# Altium footprint library Connectors.PcbLib: 104 footprints (part 4 of 7)
Each footprint in its own frame and in the unit in brackets; x right, y up, seen from the top. Pads: shape width x height; smd on the part's side, far side on the other; paste and mask are expansions set on the pad; w line width, h text height; cw(c..) or ccw(c..) is an arc to the next point about the centre after c.
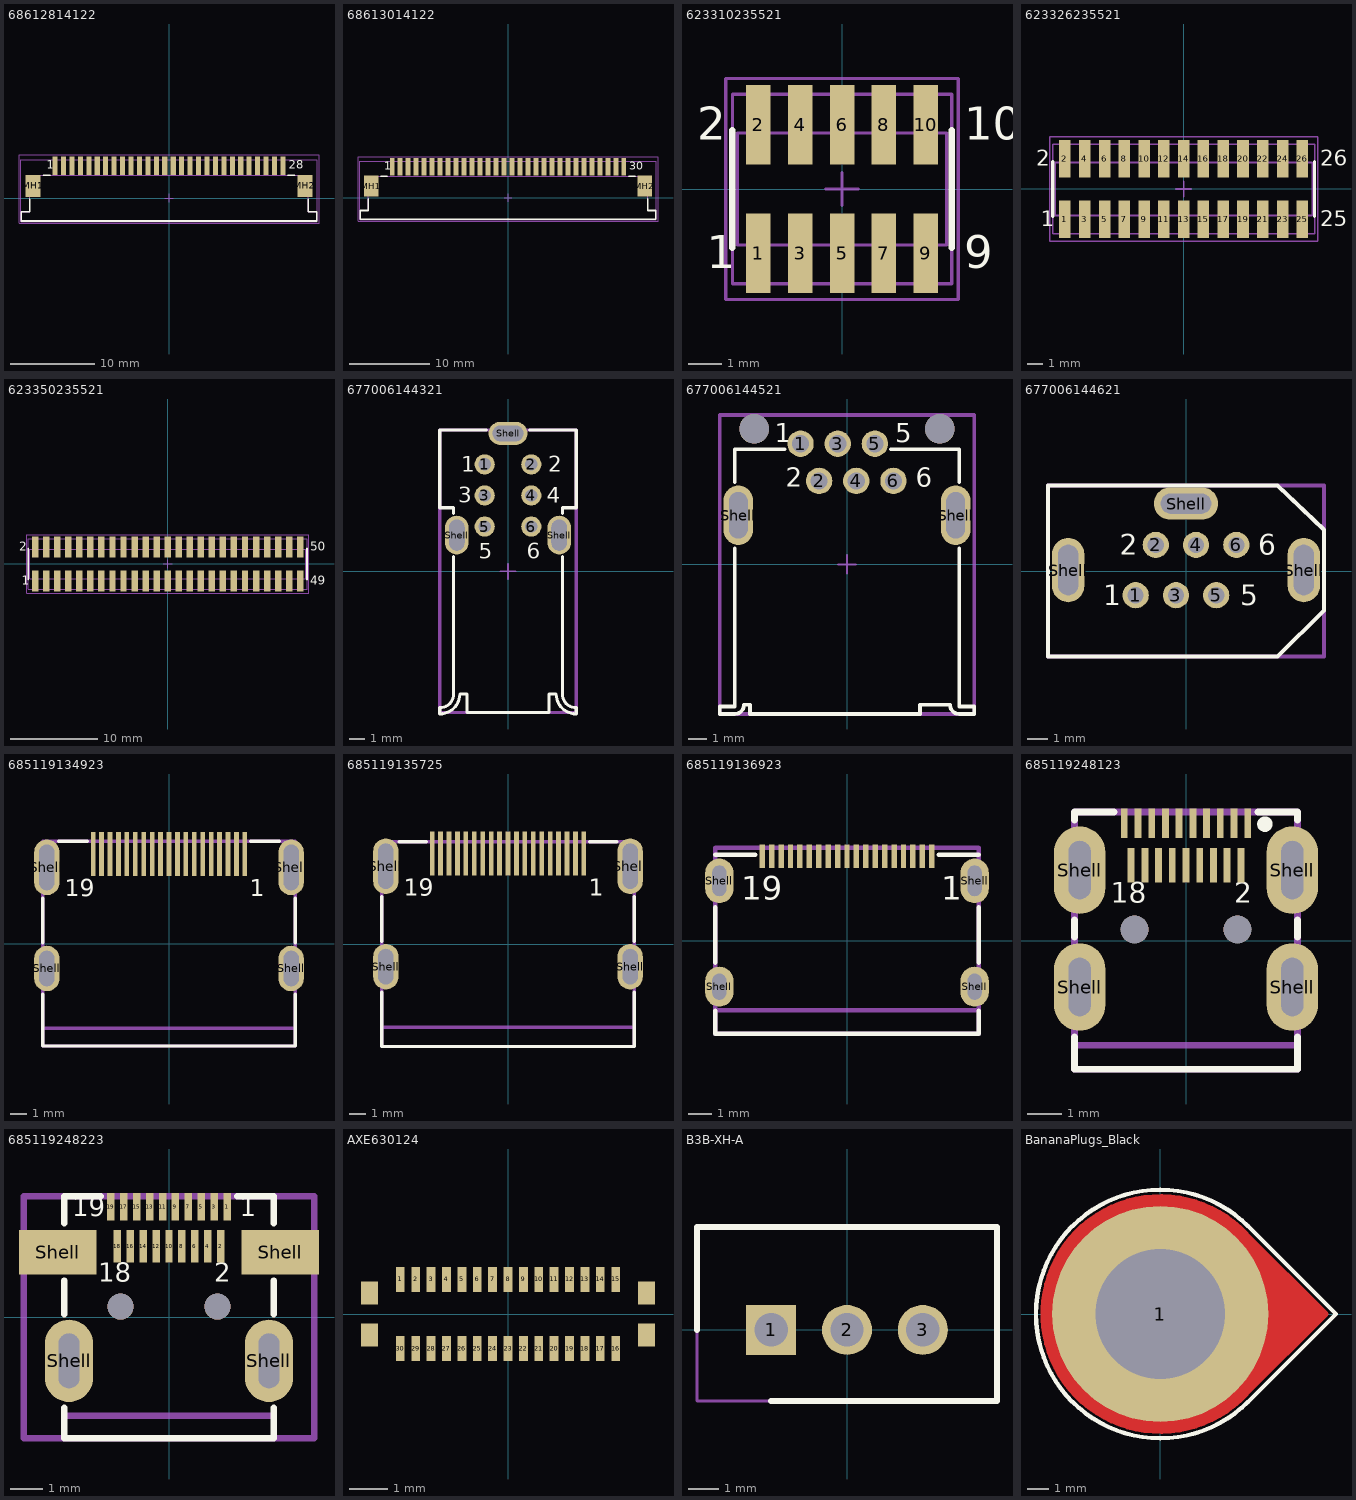
[diagram p3: the footprints below, top view; thin cyan lines are the x and y axes]

## 68612814122 [mm] "ZIF Connectors, Horizontal, Top Contact, pitch 1mm, 28p"
height 3.15
pads (30):
  rect 0.6x2.2 smd: 1(-13.5,3.85) 2(-12.5,3.85) 3(-11.5,3.85) 4(-10.5,3.85) 5(-9.5,3.85) 6(-8.5,3.85) 7(-7.5,3.85) 8(-6.5,3.85) 9(-5.5,3.85) 10(-4.5,3.85) 11(-3.5,3.85) 12(-2.5,3.85) 13(-1.5,3.85) 14(-0.5,3.85) 15(0.5,3.85) 16(1.5,3.85) 17(2.5,3.85) 18(3.5,3.85) 19(4.5,3.85) 20(5.5,3.85) 21(6.5,3.85) 22(7.5,3.85) 23(8.5,3.85) 24(9.5,3.85) 25(10.5,3.85) 26(11.5,3.85) 27(12.5,3.85) 28(13.5,3.85)
  rect 1.8x2.6 smd: MH1(-16.1,1.45) MH2(16.1,1.45)
Top Overlay:
  lines w0.2: -16.5,-0.15 -16.5,-1.6 -17.5,-1.6 -17.5,-2.7 17.5,-2.7 17.5,-1.6 16.5,-1.6 16.5,-0.15 ; -14.9,2.7 -14.1,2.7 ; 14.1,2.7 14.9,2.7
  text "1" at -14.5,3.5 h1
  text "28" at 14.2,3.5 h1
Mechanical 11:
  lines w0.1: -17.5,-2.7 17.5,-2.7 17.5,-1.6 16.5,-1.6 16.5,2.7 -16.5,2.7 -16.5,-1.6 -17.5,-1.6 -17.5,-2.7
Mechanical 13:
  lines w0.1: -17.575,-2.775 -17.575,4.575 17.575,4.575 17.575,-2.775 -17.575,-2.775
Mechanical 15:
  lines w0.1: -0.5,0 0.5,0 ; 0,-0.5 0,0.5 ; -17.775,-2.975 17.775,-2.975 17.775,5.15 -17.775,5.15 -17.775,-2.975
3D body "68612814122.stp": height 3.02, standoff 0.02, extent -17.5,-2.7 17.5,4.4

## 68613014122 [mm] "ZIF Connectors, Horizontal, Top Contact, pitch 1mm, 30p"
height 3.15
pads (32):
  rect 0.6x2.2 smd: 1(-14.5,3.85) 2(-13.5,3.85) 3(-12.5,3.85) 4(-11.5,3.85) 5(-10.5,3.85) 6(-9.5,3.85) 7(-8.5,3.85) 8(-7.5,3.85) 9(-6.5,3.85) 10(-5.5,3.85) 11(-4.5,3.85) 12(-3.5,3.85) 13(-2.5,3.85) 14(-1.5,3.85) 15(-0.5,3.85) 16(0.5,3.85) 17(1.5,3.85) 18(2.5,3.85) 19(3.5,3.85) 20(4.5,3.85) 21(5.5,3.85) 22(6.5,3.85) 23(7.5,3.85) 24(8.5,3.85) 25(9.5,3.85) 26(10.5,3.85) 27(11.5,3.85) 28(12.5,3.85) 29(13.5,3.85) 30(14.5,3.85)
  rect 1.8x2.6 smd: MH1(-17.1,1.45) MH2(17.1,1.45)
Top Overlay:
  lines w0.2: -17.5,-0.15 -17.5,-1.6 -18.5,-1.6 -18.5,-2.7 18.5,-2.7 18.5,-1.6 17.5,-1.6 17.5,-0.15 ; -15.9,2.7 -15.1,2.7 ; 15.1,2.7 15.9,2.7
  text "30" at 15.2,3.5 h1
  text "1" at -15.5,3.5 h1
Mechanical 11:
  lines w0.1: -18.5,-2.7 -18.5,-1.6 -17.5,-1.6 -17.5,2.7 17.5,2.7 17.5,-1.6 18.5,-1.6 18.5,-2.7 -18.5,-2.7
Mechanical 13:
  lines w0.1: -18.575,-2.775 18.575,-2.775 18.575,4.575 -18.575,4.575 -18.575,-2.775
Mechanical 15:
  lines w0.1: -0.5,0 0.5,0 ; 0,-0.5 0,0.5 ; -18.775,-2.975 -18.775,5.15 18.775,5.15 18.775,-2.975 -18.775,-2.975
3D body "68613014122.stp": height 3.02, standoff 0.02, extent -18.5,-2.7 18.5,4.4

## 623310235521 [mm] "Pin Header, pitch 1.27 mm, SMD, Vertical, dual row, 10p"
height 4.45
pads (10):
  rect 0.74x2.4 smd: 1(-2.54,-1.95) 2(-2.54,1.95) 3(-1.27,-1.95) 4(-1.27,1.95) 5(0,-1.95) 6(0,1.95) 7(1.27,-1.95) 8(1.27,1.95) 9(2.54,-1.95) 10(2.54,1.95)
Top Overlay:
  lines w0.2: -3.325,-1.775 -3.325,1.775 ; 3.325,-1.775 3.325,1.775
  text "1" at -4.1,-2.4 h1
  text "2" at -4.4,1.5 h1
  text "9" at 3.7,-2.4 h1
  text "10" at 3.7,1.5 h1
Mechanical 11:
  lines w0.1: -3.175,-1.7 -3.175,1.7 3.175,1.7 3.175,-1.7 -3.175,-1.7
Mechanical 13:
  lines w0.1: -3.325,-2.875 -3.325,2.875 3.325,2.875 3.325,-2.875 -3.325,-2.875
Mechanical 15:
  lines w0.1: -0.5,0 0.5,0 ; 0,-0.5 0,0.5 ; -3.525,-3.35 -3.525,3.35 3.525,3.35 3.525,-3.35 -3.525,-3.35
3D body "623310235521.stp": height 6, standoff 0, extent -3.175,-2.75 3.175,2.75

## 623326235521 [mm] "Pin Header, pitch 1.27 mm, SMD, Vertical, dual row, 26p"
height 4.45
pads (26):
  rect 0.74x2.4 smd: 1(-7.62,-1.95) 2(-7.62,1.95) 3(-6.35,-1.95) 4(-6.35,1.95) 5(-5.08,-1.95) 6(-5.08,1.95) 7(-3.81,-1.95) 8(-3.81,1.95) 9(-2.54,-1.95) 10(-2.54,1.95) 11(-1.27,-1.95) 12(-1.27,1.95) 13(0,-1.95) 14(0,1.95) 15(1.27,-1.95) 16(1.27,1.95) 17(2.54,-1.95) 18(2.54,1.95) 19(3.81,-1.95) 20(3.81,1.95) 21(5.08,-1.95) 22(5.08,1.95) 23(6.35,-1.95) 24(6.35,1.95) 25(7.62,-1.95) 26(7.62,1.95)
Top Overlay:
  lines w0.2: -8.405,-1.775 -8.405,1.775 ; 8.405,-1.775 8.405,1.775
  text "1" at -9.18,-2.4 h1
  text "2" at -9.48,1.5 h1
  text "26" at 8.78,1.5 h1
  text "25" at 8.78,-2.4 h1
Mechanical 11:
  lines w0.1: -8.255,-1.7 -8.255,1.7 8.255,1.7 8.255,-1.7 -8.255,-1.7
Mechanical 13:
  lines w0.1: -8.405,-2.875 -8.405,2.875 8.405,2.875 8.405,-2.875 -8.405,-2.875
Mechanical 15:
  lines w0.1: -0.5,0 0.5,0 ; 0,-0.5 0,0.5 ; -8.605,-3.35 -8.605,3.35 8.605,3.35 8.605,-3.35 -8.605,-3.35
3D body "623326235521.stp": height 6, standoff 0, extent -8.255,-2.75 8.255,2.75

## 623350235521 [mm] "Pin Header, pitch 1.27 mm, SMD, Vertical, dual row, 50p"
height 4.45
pads (50):
  rect 0.74x2.4 smd: 1(-15.24,-1.95) 2(-15.24,1.95) 3(-13.97,-1.95) 4(-13.97,1.95) 5(-12.7,-1.95) 6(-12.7,1.95) 7(-11.43,-1.95) 8(-11.43,1.95) 9(-10.16,-1.95) 10(-10.16,1.95) 11(-8.89,-1.95) 12(-8.89,1.95) 13(-7.62,-1.95) 14(-7.62,1.95) 15(-6.35,-1.95) 16(-6.35,1.95) 17(-5.08,-1.95) 18(-5.08,1.95) 19(-3.81,-1.95) 20(-3.81,1.95) 21(-2.54,-1.95) 22(-2.54,1.95) 23(-1.27,-1.95) 24(-1.27,1.95) 25(0,-1.95) 26(0,1.95) 27(1.27,-1.95) 28(1.27,1.95) 29(2.54,-1.95) 30(2.54,1.95) 31(3.81,-1.95) 32(3.81,1.95) 33(5.08,-1.95) 34(5.08,1.95) 35(6.35,-1.95) 36(6.35,1.95) 37(7.62,-1.95) 38(7.62,1.95) 39(8.89,-1.95) 40(8.89,1.95) 41(10.16,-1.95) 42(10.16,1.95) 43(11.43,-1.95) 44(11.43,1.95) 45(12.7,-1.95) 46(12.7,1.95) 47(13.97,-1.95) 48(13.97,1.95) 49(15.24,-1.95) 50(15.24,1.95)
Top Overlay:
  lines w0.2: -16.025,-1.775 -16.025,1.775 ; 16.025,-1.775 16.025,1.775
  text "1" at -16.8,-2.4 h1
  text "2" at -17.1,1.5 h1
  text "49" at 16.4,-2.4 h1
  text "50" at 16.4,1.5 h1
Mechanical 11:
  lines w0.1: -15.875,-1.7 -15.875,1.7 15.875,1.7 15.875,-1.7 -15.875,-1.7
Mechanical 13:
  lines w0.1: -16.025,-2.875 -16.025,2.875 16.025,2.875 16.025,-2.875 -16.025,-2.875
Mechanical 15:
  lines w0.1: -0.5,0 0.5,0 ; 0,-0.5 0,0.5 ; -16.225,-3.35 -16.225,3.35 16.225,3.35 16.225,-3.35 -16.225,-3.35
3D body "623350235521.stp": height 6, standoff 0, extent -15.875,-2.75 15.875,2.75

## 677006144321 [mm] "IEEE 1394 Up Right Receptacle WR-COM"
height 14
pads (9):
  round 1.3 hole 0.8: 1(-1.5,6.89) 2(1.5,6.89) 3(-1.5,4.89) 4(1.5,4.89) 5(-1.5,2.89) 6(1.5,2.89)
  oval 1.5x2.5 hole 1 slot 2 at 90 deg: Shell(-3.3,2.34) Shell(3.3,2.34)
  oval 2.5x1.5 hole 1 slot 2 at 0 deg: Shell(0,8.89)
Top Overlay:
  lines w0.2: -3.5,0.94 -3.5,-7.89 cw(c-4.4,-7.89) -4.4,-8.79 -4.4,-9.19 ccw(c-4.4,-7.89) -3.1,-7.89 -2.65,-7.89 -2.65,-9.1 2.65,-9.1 2.65,-7.89 3.1,-7.89 ccw(c4.4,-7.89) 4.4,-9.19 4.4,-8.79 cw(c4.4,-7.89) 3.5,-7.89 3.5,0.94 ; -3.5,3.74 -3.5,4.1 -4.4,4.1 -4.4,9.1 -1.4,9.1 ; 1.4,9.1 4.4,9.1 4.4,4.1 3.5,4.1 3.5,3.74
  text "1" at -3,6.415 h1.02
  text "2" at 2.6,6.415 h1.02
  text "3" at -3.2,4.415 h1.02
  text "4" at 2.5,4.415 h1.02
  text "5" at -1.9,0.815 h1.02
  text "6" at 1.2,0.815 h1.02
Mechanical 13:
  lines w0.2: -4.4,-9.1 -4.4,9.1 4.4,9.1 4.4,-9.1 -4.4,-9.1
Mechanical 15:
  lines w0.1: -0.5,0 0.5,0 ; 0,-0.5 0,0.5
3D body "677006144321.stp": height 13.4, standoff -3.24, extent -4.4,-9.1 4.4,9.1

## 677006144521 [mm] "IEEE 1394 Horizontal Receptacle WR-COM"
height 7.95
pads (10):
  round 1.42 hole 0.92: 1(-2.5,6.5) 2(-1.5,4.5) 3(-0.5,6.5) 4(0.5,4.5) 5(1.5,6.5) 6(2.5,4.5)
  oval 1.6x3.2 hole 1 slot 2.5 at 90 deg: Shell(-5.85,2.65) Shell(5.85,2.65)
  round 1.6 hole 1.6 unplated: ""(-5,7.3) ""(5,7.3)
Top Overlay:
  lines w0.2: -6.05,0.88 -6.05,-7.65 -6.85,-7.65 -6.85,-8.05 -6.039,-8.05 ; -6.05,4.43 -6.05,6.2 -3.36,6.2 ; -6.039,-8.05 ccw(c-6.039,-7.561) -5.55,-7.549 -5.22,-7.55 -5.22,-8.05 3.93,-8.05 3.93,-7.55 5.55,-7.55 ; 2.36,6.2 6.05,6.2 6.05,4.43 ; 5.55,-7.549 ccw(c6.039,-7.561) 6.039,-8.05 ; 6.039,-8.05 6.85,-8.05 6.85,-7.65 6.05,-7.65 6.05,0.88
  text "1" at -3.9,6.575 h1.02
  text "5" at 2.6,6.575 h1.02
  text "2" at -3.3,4.175 h1.02
  text "6" at 3.7,4.175 h1.02
Mechanical 13:
  lines w0.2: -6.85,-8.05 -6.85,8.05 6.85,8.05 6.85,-8.05 -6.85,-8.05
Mechanical 15:
  lines w0.1: -0.5,0 0.5,0 ; 0,-0.5 0,0.5
3D body "677006144521.stp": height 8.8, standoff -3.3, extent -6.85,-8.05 6.85,8.05

## 677006144621 [mm] "IEEE 1394 Vertical Receptacle"
height 14.8
pads (9):
  round 1.3 hole 0.8: 1(-2.5,-1.2) 2(-1.5,1.3) 3(-0.5,-1.2) 4(0.5,1.3) 5(1.5,-1.2) 6(2.5,1.3)
  oval 1.6x3.2 hole 1 slot 2.5 at 90 deg: Shell(-5.85,0.05) Shell(5.85,0.05)
  oval 3.2x1.6 hole 1 slot 2.5 at 0 deg: Shell(0,3.35)
Top Overlay:
  lines w0.2: -6.85,-4.25 -6.85,4.25 4.55,4.25 6.85,2.05 6.85,-1.95 4.55,-4.25 -6.85,-4.25
  text "1" at -4.1,-1.7 h1.02
  text "2" at -3.3,0.8 h1.02
  text "5" at 2.7,-1.7 h1.02
  text "6" at 3.6,0.8 h1.02
Mechanical 13:
  lines w0.2: -6.85,-4.25 6.85,-4.25 6.85,4.25 -6.85,4.25 -6.85,-4.25
3D body "677006144621.stp": height 14.8, standoff -3.45, extent -6.85,-4.2 6.85,4.3

## 685119134923 [mm] "HDMI SMT Horizontal"
height 6.13
pads (23):
  rect 0.28x2.6 smd: 1(4.5,5.325) 2(4,5.325) 3(3.5,5.325) 4(3,5.325) 5(2.5,5.325) 6(2,5.325) 7(1.5,5.325) 8(1,5.325) 9(0.5,5.325) 10(0,5.325) 11(-0.5,5.325) 12(-1,5.325) 13(-1.5,5.325) 14(-2,5.325) 15(-2.5,5.325) 16(-3,5.325) 17(-3.5,5.325) 18(-4,5.325) 19(-4.5,5.325)
  oval 1.5x2.7 hole 0.9 slot 2.1 at 90 deg: Shell(-7.25,-1.475) Shell(7.25,-1.475)
  oval 1.5x3.3 hole 0.9 slot 2.7 at 90 deg: Shell(-7.25,4.525) Shell(7.25,4.525)
Top Overlay:
  lines w0.2: -7.5,-2.985 -7.5,-6.075 7.5,-6.075 7.5,-2.985 ; -7.5,0.035 -7.5,2.705 ; -6.55,6.075 -4.84,6.075 ; 4.84,6.075 6.55,6.075 ; 7.5,0.035 7.5,2.705
  text "1" at 4.8,2.8 h1.02
  text "19" at -6.2,2.8 h1.02
Mechanical 13:
  lines w0.2: -7.5,-6.075 -7.5,6.075 7.5,6.075 7.5,-6.075 -7.5,-6.075
Mechanical 15:
  lines w0.2: -7.5,-5.025 7.5,-5.025
  text "PCB Edge" at -1.794,-4.721 h1
3D body "685119134923.stp": height 6.17, standoff -2.21, extent -7.5,-6.075 7.5,6.075

## 685119135725 [mm] "HDMI SMT Horizontal with M3 screw"
height 16.05
pads (23):
  rect 0.28x2.6 smd: 1(4.5,5.385) 2(4,5.385) 3(3.5,5.385) 4(3,5.385) 5(2.5,5.385) 6(2,5.385) 7(1.5,5.385) 8(1,5.385) 9(0.5,5.385) 10(0,5.385) 11(-0.5,5.385) 12(-1,5.385) 13(-1.5,5.385) 14(-2,5.385) 15(-2.5,5.385) 16(-3,5.385) 17(-3.5,5.385) 18(-4,5.385) 19(-4.5,5.385)
  oval 1.5x2.7 hole 0.9 slot 2.1 at 90 deg: Shell(-7.25,-1.335) Shell(7.25,-1.335)
  oval 1.5x3.3 hole 0.9 slot 2.7 at 90 deg: Shell(-7.25,4.625) Shell(7.25,4.625)
Top Overlay:
  lines w0.2: -7.5,-2.845 -7.5,-6.075 7.5,-6.075 7.5,-2.845 ; -7.5,0.175 -7.5,2.815 ; -6.47,6.075 -4.84,6.075 ; 4.84,6.075 6.47,6.075 ; 7.5,0.175 7.5,2.815
  text "19" at -6.2,2.86 h1.02
  text "1" at 4.8,2.86 h1.02
Mechanical 13:
  lines w0.2: -7.5,-6.075 -7.5,6.075 7.5,6.075 7.5,-6.075 -7.5,-6.075
Mechanical 15:
  lines w0.2: -7.5,-4.925 7.5,-4.925
  text "PCB Edge" at -1.794,-4.621 h1
3D body "685119135725.stp": height 16.1, standoff -2.15, extent -7.5,-6.075 7.5,6.075

## 685119136923 [mm] "Mini HDMI SMT Horizontal"
height 3.3
pads (23):
  rect 0.23x1 smd: 1(3.6,3.6) 2(3.2,3.6) 3(2.8,3.6) 4(2.4,3.6) 5(2,3.6) 6(1.6,3.6) 7(1.2,3.6) 8(0.8,3.6) 9(0.4,3.6) 10(0,3.6) 11(-0.4,3.6) 12(-0.8,3.6) 13(-1.2,3.6) 14(-1.6,3.6) 15(-2,3.6) 16(-2.4,3.6) 17(-2.8,3.6) 18(-3.2,3.6) 19(-3.6,3.6)
  oval 1.2x1.7 hole 0.6 slot 1.1 at 90 deg: Shell(-5.425,-1.95) Shell(5.425,-1.95)
  oval 1.2x1.9 hole 0.6 slot 1.3 at 90 deg: Shell(-5.425,2.55) Shell(5.425,2.55)
Top Overlay:
  lines w0.2: -5.6,-2.98 -5.6,-3.95 5.6,-3.95 5.6,-2.98 ; -5.6,-0.92 -5.6,1.42 ; -5.6,3.65 -3.9,3.65 ; 3.9,3.65 5.6,3.65 ; 5.6,-0.92 5.6,1.42
  text "19" at -4.5,1.75 h1.02
  text "1" at 4,1.75 h1.02
Mechanical 13:
  lines w0.2: -5.6,-3.95 5.6,-3.95 5.6,3.95 -5.6,3.95 -5.6,-3.95
Mechanical 15:
  lines w0.2: -5.6,-2.95 5.6,-2.95
  text "PCB Edge" at -1.794,-2.646 h0.89
3D body "685119136923.stp": height 3.29, standoff -2.16, extent -5.625,-3.95 5.625,3.952

## 685119248123 [mm] "Micro HDMI Horizontal SMT"
height 3
pads (25):
  rect 0.2x0.85 smd: 1(1.8,3.425) 3(1.4,3.425) 5(1,3.425) 7(0.6,3.425) 9(0.2,3.425) 11(-0.2,3.425) 13(-0.6,3.425) 15(-1,3.425) 17(-1.4,3.425) 19(-1.8,3.425)
  rect 0.2x1 smd: 2(1.6,2.2) 4(1.2,2.2) 6(0.8,2.2) 8(0.4,2.2) 10(0,2.2) 12(-0.4,2.2) 14(-0.8,2.2) 16(-1.2,2.2) 18(-1.6,2.2)
  oval 1.5x2.55 hole 0.65 slot 1.7 at 90 deg: Shell(-3.1,-1.35) Shell(-3.1,2.06) Shell(3.1,-1.35) Shell(3.1,2.06)
  round 0.81 hole 0.81 unplated: ""(-1.5,0.33) ""(1.5,0.33)
Top Overlay:
  circle w0.25: c2.3,3.4 r0.1
  lines w0.2: -3.25,-2.81 -3.25,-3.75 3.25,-3.75 3.25,-2.81 ; -3.25,0.11 -3.25,0.6 ; -3.25,3.52 -3.25,3.75 -2.1,3.75 ; 2.1,3.75 3.25,3.75 3.25,3.52 ; 3.25,0.11 3.25,0.6
  text "2" at 1.4,0.9 h1.02
  text "18" at -2.2,0.9 h1.02
Mechanical 13:
  lines w0.2: -3.25,-3.75 3.25,-3.75 3.25,3.75 -3.25,3.75 -3.25,-3.75
Mechanical 15:
  lines w0.2: -3.25,-3.05 3.25,-3.05
  text "PCB Edge" at -1.794,-2.746 h0.89
3D body "685119248123.stp": height 2.99, standoff -1.11, extent -3.25,-3.75 3.25,3.755

## 685119248223 [mm] "Micro HDMI Horizontal SMT Hybrid Mount"
height 3
pads (25):
  rect 0.23x0.85 smd: 1(1.8,3.425) 3(1.4,3.425) 5(1,3.425) 7(0.6,3.425) 9(0.2,3.425) 11(-0.2,3.425) 13(-0.6,3.425) 15(-1,3.425) 17(-1.4,3.425) 19(-1.8,3.425)
  rect 0.23x1 smd: 2(1.6,2.2) 4(1.2,2.2) 6(0.8,2.2) 8(0.4,2.2) 10(0,2.2) 12(-0.4,2.2) 14(-0.8,2.2) 16(-1.2,2.2) 18(-1.6,2.2)
  rect 2.4x1.38 smd: Shell(-3.45,2.02) Shell(3.45,2.02)
  oval 1.5x2.55 hole 0.65 slot 1.7 at 90 deg: Shell(-3.1,-1.35) Shell(3.1,-1.35)
  round 0.81 hole 0.81 unplated: ""(-1.5,0.33) ""(1.5,0.33)
Top Overlay:
  lines w0.2: -3.25,-2.81 -3.25,-3.75 3.25,-3.75 3.25,-2.81 ; -3.25,0.1 -3.25,1.14 ; -3.25,2.91 -3.25,3.75 -2.12,3.75 ; 2.12,3.75 3.25,3.75 3.25,2.91 ; 3.25,0.1 3.25,1.14
  text "1" at 2.2,2.938 h1.02
  text "19" at -3,2.938 h1.02
  text "18" at -2.2,0.9 h1.02
  text "2" at 1.4,0.9 h1.02
Mechanical 13:
  lines w0.2: -4.509,-3.75 -4.509,3.75 4.509,3.75 4.509,-3.75 -4.509,-3.75
Mechanical 15:
  lines w0.2: -3.25,-3.05 3.25,-3.05
  text "PCB Edge" at -1.794,-2.746 h0.89
3D body "685119248223.stp": height 2.99, standoff -1.11, extent -4.509,-3.75 4.509,3.755

## AXE630124 [mm]
pads (34):
  rect 0.23x0.65 smd mask+0.05: 1(-2.8,0.9) 2(-2.4,0.9) 3(-2,0.9) 4(-1.6,0.9) 5(-1.2,0.9) 6(-0.8,0.9) 7(-0.4,0.9) 8(0,0.9) 9(0.4,0.9) 10(0.8,0.9) 11(1.2,0.9) 12(1.6,0.9) 13(2,0.9) 14(2.4,0.9) 15(2.8,0.9) 16(2.8,-0.9) 17(2.4,-0.9) 18(2,-0.9) 19(1.6,-0.9) 20(1.2,-0.9) 21(0.8,-0.9) 22(0.4,-0.9) 23(0,-0.9) 24(-0.4,-0.9) 25(-0.8,-0.9) 26(-1.2,-0.9) 27(-1.6,-0.9) 28(-2,-0.9) 29(-2.4,-0.9) 30(-2.8,-0.9)
  rect 0.45x0.6 smd mask+0.05: ""(-3.6,-0.55) ""(-3.6,0.55) ""(3.6,-0.55) ""(3.6,0.55)
3D body "axe630124.stp": height 0.65, standoff 0, extent -3.9,-1 3.9,1

## B3B-XH-A [mm]
pads (3):
  rect 1.65x1.65 / inner round 1.65 / far side rect 1.65x1.65 hole 1.1: 1(-2.5,0)
  round 1.65 hole 1.1: 2(0,0) 3(2.5,0)
Top Overlay:
  lines w0.2: -4.95,0 -4.95,3.4 4.95,3.4 4.95,-2.35 -2.5,-2.35
Mechanical 15:
  lines w0.1: -4.95,-2.35 4.95,-2.35 4.95,3.4 -4.95,3.4 -4.95,-2.35

## BananaPlugs_Black [mil]
pads (1):
  round 400 hole 240: 1(0,0)
Top Layer:
  region: 158.64,-146.59 148.87,-157.16 126.7,-175.53 102.29,-190.79 76.06,-202.68 48.5,-210.98 20.07,-215.55 -8.71,-216.3 -37.33,-213.24 -65.3,-206.4 -92.11,-195.9 -117.29,-181.95 -140.4,-164.78 -161.02,-144.69 -178.8,-122.04 -193.41,-97.23 -204.61,-70.71 -212.18,-42.93 -216,-14.4 -216,14.4 -212.18,42.93 -204.61,70.71 -193.41,97.23 -178.8,122.04 -161.02,144.69 -140.4,164.78 -117.29,181.95 -92.11,195.9 -65.3,206.4 -37.33,213.24 -8.71,216.3 20.07,215.55 48.5,210.98 76.06,202.68 102.29,190.79 126.7,175.53 148.87,157.16 158.64,146.59 159,146 305,0
  lines w12: 158.64,-146.59 cw(c0,0) 158.64,146.59 ; 159,-146 305,0 159,146
Bottom Layer:
  region: 158.64,-146.59 148.87,-157.16 126.7,-175.53 102.29,-190.79 76.07,-202.68 48.5,-210.98 20.07,-215.55 -8.71,-216.3 -37.33,-213.24 -65.3,-206.4 -92.11,-195.9 -117.29,-181.95 -140.4,-164.78 -161.02,-144.69 -178.8,-122.04 -193.41,-97.23 -204.61,-70.71 -212.18,-42.93 -216,-14.4 -216,14.4 -212.18,42.93 -204.61,70.71 -193.41,97.23 -178.8,122.04 -161.02,144.69 -140.4,164.78 -117.29,181.95 -92.11,195.9 -65.3,206.4 -37.33,213.24 -8.71,216.3 20.07,215.55 48.5,210.98 76.07,202.68 102.29,190.79 126.7,175.53 148.87,157.16 158.64,146.59 159,146 305,0
Top Overlay:
  lines w8: 162.63,-162.63 cw(c0,0) 162.63,162.63 325.27,0 162.63,-162.63
Bottom Overlay:
  lines w8: 162.63,-162.63 cw(c0,0) 162.63,162.63 325.27,0 162.63,-162.63
Top Solder:
  region: 158.64,-146.59 148.87,-157.16 126.7,-175.53 102.29,-190.79 76.07,-202.68 48.5,-210.98 20.07,-215.55 -8.71,-216.3 -37.33,-213.24 -65.3,-206.4 -92.11,-195.9 -117.29,-181.95 -140.4,-164.78 -161.02,-144.69 -178.8,-122.04 -193.41,-97.23 -204.61,-70.71 -212.18,-42.93 -216,-14.4 -216,14.4 -212.18,42.93 -204.61,70.71 -193.41,97.23 -178.8,122.04 -161.02,144.69 -140.4,164.78 -117.29,181.95 -92.11,195.9 -65.3,206.4 -37.33,213.24 -8.71,216.3 20.07,215.55 48.5,210.98 76.07,202.68 102.29,190.79 126.7,175.53 148.87,157.16 158.64,146.59 159,146 305,0
Bottom Solder:
  region: 158.64,-146.59 148.87,-157.16 126.7,-175.53 102.29,-190.79 76.07,-202.68 48.5,-210.98 20.07,-215.55 -8.71,-216.3 -37.33,-213.24 -65.3,-206.4 -92.11,-195.9 -117.29,-181.95 -140.4,-164.78 -161.02,-144.69 -178.8,-122.04 -193.41,-97.23 -204.61,-70.71 -212.18,-42.93 -216,-14.4 -216,14.4 -212.18,42.93 -204.61,70.71 -193.41,97.23 -178.8,122.04 -161.02,144.69 -140.4,164.78 -117.29,181.95 -92.11,195.9 -65.3,206.4 -37.33,213.24 -8.71,216.3 20.07,215.55 48.5,210.98 76.07,202.68 102.29,190.79 126.7,175.53 148.87,157.16 158.64,146.59 159,146 305,0
3D body "User Library-ST-351B V1 - BLACK.STEP": height 326.77, standoff -303.18, extent -222.44,-222.19 456.69,222.19